# Altium footprint library klp.PcbLib: 436 footprints (part 10 of 28)
Each footprint in its own frame and in the unit in brackets; x right, y up, seen from the top. Pads: shape width x height; smd on the part's side, far side on the other; paste and mask are expansions set on the pad; w line width, h text height; cw(c..) or ccw(c..) is an arc to the next point about the centre after c.
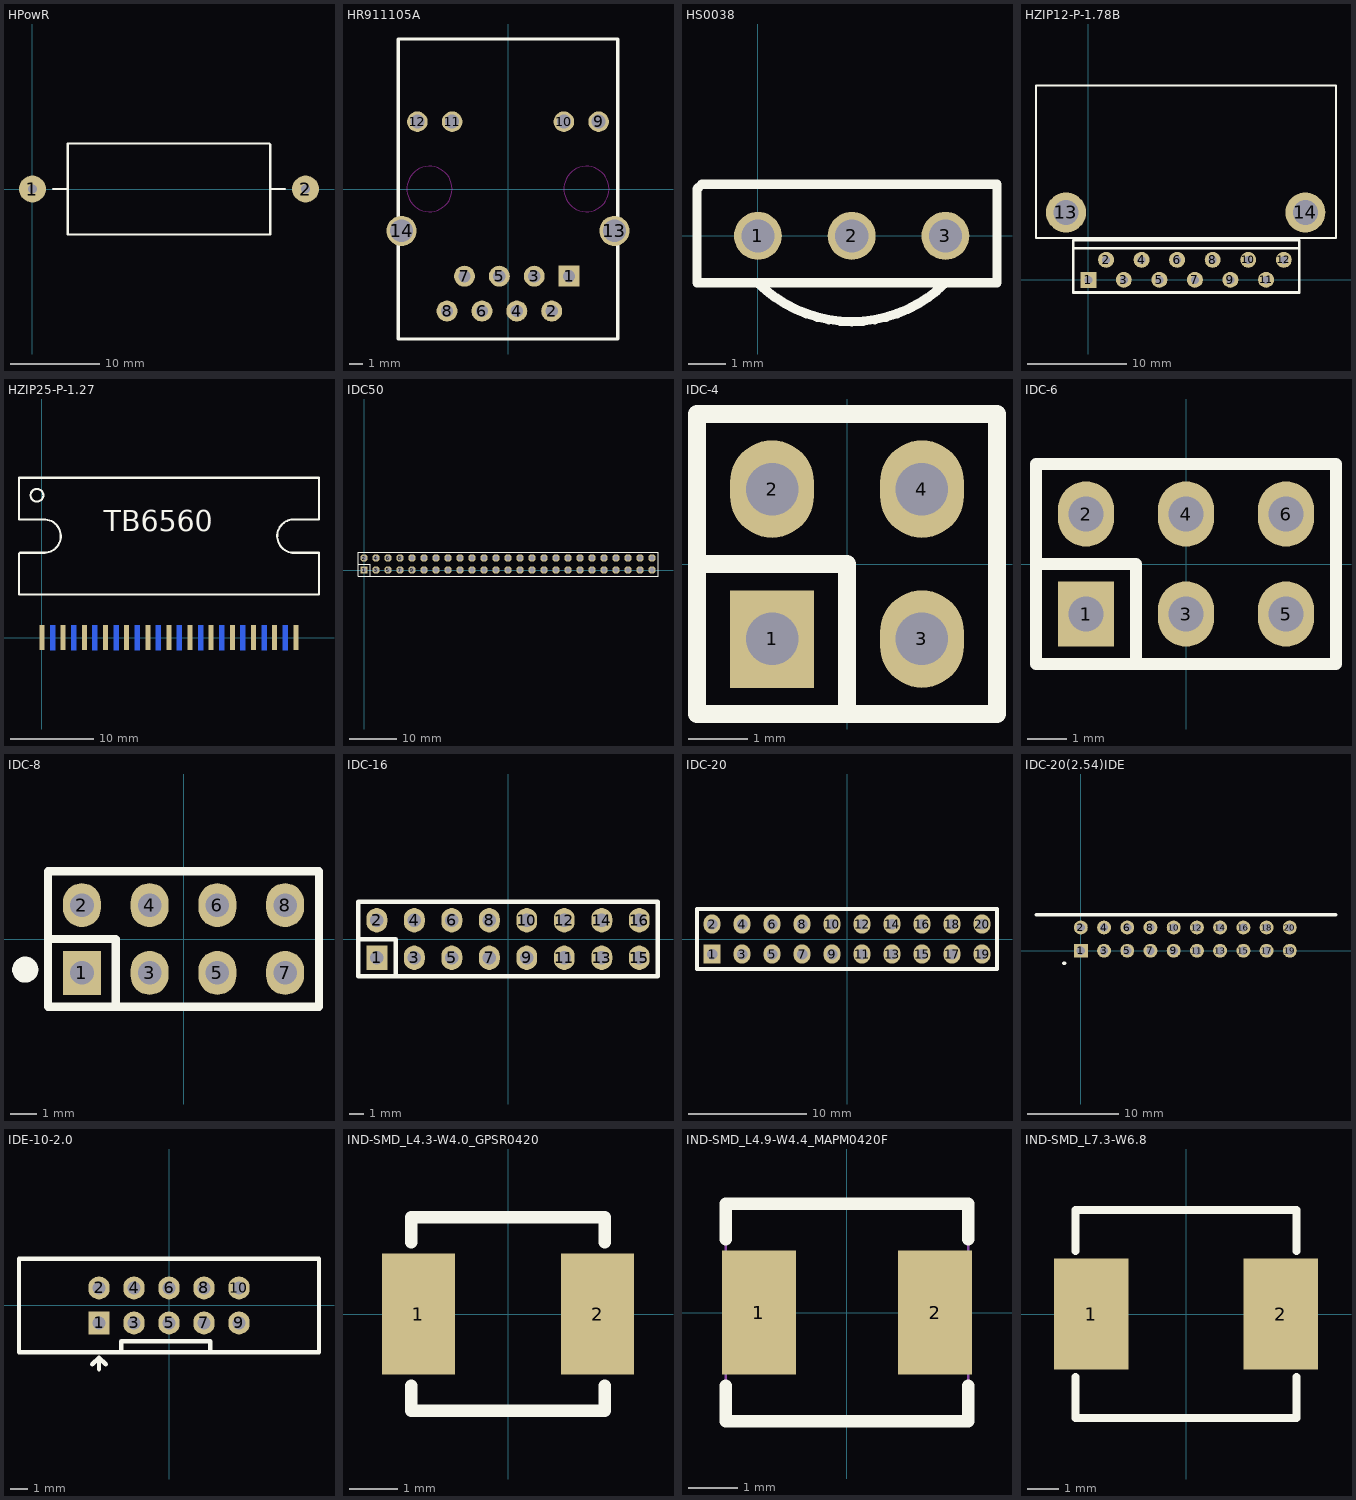
[diagram p9: the footprints below, top view; thin cyan lines are the x and y axes]

## HPowR [mm] "HPR"
height 10
pads (2):
  round 3 hole 1: 1(0,0) 2(30.48,0)
Top Overlay:
  lines w0.254: 2.286,0 3.937,0 ; 26.543,-2.921 26.543,2.794 ; 26.543,-2.667 26.543,-5.08 3.937,-5.08 3.937,-2.667 3.937,2.54 3.937,5.08 26.416,5.08 26.543,4.953 26.543,2.413 ; 26.543,0 28.194,0

## HR911105A [mm]
pads (14):
  rect 1.524x1.524 hole 0.889: 1(4.45,-6.35)
  round 1.524 hole 0.889: 2(3.18,-8.89) 3(1.91,-6.35) 4(0.64,-8.89) 5(-0.63,-6.35) 6(-1.9,-8.89) 7(-3.17,-6.35) 8(-4.44,-8.89)
  round 1.5 hole 1.02: 9(6.6,4.9) 10(4.064,4.9) 11(-4.064,4.9) 12(-6.6,4.9)
  round 2.2 hole 1.65: 13(7.75,-3.048) 14(-7.75,-3.048)
Top Overlay:
  lines w0.254: -8,-10.922 -8,10.922 0,10.922 8,10.922 8,-10.922 0,-10.922 -8,-10.922
Keep-Out Layer:
  circle w0.051: c-5.714,0 r1.65
  circle w0.051: c5.716,0 r1.65
3D body "User Library-HR911105A.step": height 14, standoff -2.5, extent -7.975,-10.475 7.905,10.925

## HS0038 [mm]
height 2.54
pads (3):
  round 1.3 hole 0.9: 1(0,0) 2(2.54,0) 3(5.08,0)
Top Overlay:
  lines w0.254: 0,-1.27 ccw(c2.54,1.27) 5.08,-1.27 ; -1.651,-1.27 6.477,-1.27 6.477,1.397 -1.524,1.397 -1.651,1.27 -1.651,-1.27

## HZIP12-P-1.78B [mm]
height 14.8
pads (14):
  rect 1.6x1.6 hole 0.8: 1(0,0)
  round 1.6 hole 0.8: 2(1.778,2) 3(3.556,0) 4(5.334,2) 5(7.112,0) 6(8.89,2) 7(10.668,0) 8(12.446,2) 9(14.224,0) 10(16.002,2) 11(17.78,0) 12(19.558,2)
  round 4 hole 2.5: 13(-2.227,6.731) 14(21.717,6.731)
Top Overlay:
  lines w0.2: -5.227,4.191 -5.227,19.431 24.779,19.431 24.779,4.191 -5.227,4.191
  lines w0.254: -1.524,3.175 21.082,3.175 ; -1.524,-1.27 -1.524,3.937 21.082,3.937 21.082,-1.27 -1.524,-1.27

## HZIP25-P-1.27 [mm] "thick:4.57,height:14,lenth:30,pin:1.27"
height 14
pads (25):
  rect 0.6x3 smd: 1(0,0) 3(2.54,0) 5(5.08,0) 7(7.62,0) 9(10.16,0) 11(12.7,0) 13(15.24,0) 15(17.78,0) 17(20.32,0) 19(22.86,0) 21(25.4,0) 23(27.94,0) 25(30.48,0)
  rect 0.6x3 smd far side: 2(1.27,0) 4(3.81,0) 6(6.35,0) 8(8.89,0) 10(11.43,0) 12(13.97,0) 14(16.51,0) 16(19.05,0) 18(21.59,0) 20(24.13,0) 22(26.67,0) 24(29.21,0)
Top Overlay:
  circle w0.254: c-0.6,17.1 r0.762
  lines w0.254: 0.2,14.195 cw(c0.26,12.195) 0.1,10.2 -2.66,10.2 -2.76,10.1 -2.76,5.2 0.8,5.2 33.26,5.2 33.26,10.2 30,10.2 ; 0.4,14.2 -2.76,14.2 -2.76,19.2 33.26,19.2 33.26,14.2 30,14.2 ; 30.3,10.2 cw(c30.24,12.2) 30.4,14.195
  text "TB6560" at 7.4,12.8 h2.5

## IDC50 [mil]
pads (50):
  rect 62x62 hole 40: 1(0,0)
  round 62 hole 40: 2(0,100) 3(100,0) 4(100,100) 5(200,0) 6(200,100) 7(300,0) 8(300,100) 9(400,0) 10(400,100) 11(500,0) 12(500,100) 13(600,0) 14(600,100) 15(700,0) 16(700,100) 17(800,0) 18(800,100) 19(900,0) 20(900,100) 21(1000,0) 22(1000,100) 23(1100,0) 24(1100,100) 25(1200,0) 26(1200,100) 27(1300,0) 28(1300,100) 29(1400,0) 30(1400,100) 31(1500,0) 32(1500,100) 33(1600,0) 34(1600,100) 35(1700,0) 36(1700,100) 37(1800,0) 38(1800,100) 39(1900,0) 40(1900,100) 41(2000,0) 42(2000,100) 43(2100,0) 44(2100,100) 45(2200,0) 46(2200,100) 47(2300,0) 48(2300,100) 49(2400,0) 50(2400,100)
Top Overlay:
  lines w6: -50,50 50,50 50,-50 ; -50,-50 2450,-50 2450,150 -50,150 -50,-50

## IDC-4 [mil]
pads (4):
  rect 56x65 hole 35: 1(-50,-50)
  oval 56x65 hole 35: 2(-50,50) 3(50,-50) 4(50,50)
Top Overlay:
  lines w12: -100,0 0,0 0,-100 ; -100,-100 100,-100 100,100 -100,100 -100,-100
3D body "HEADER.STEP": height 298.43, standoff -115.75, extent 0,-100 100,0
3D body "HEADER.STEP": height 298.43, standoff -115.75, extent -100,-100 0,0
3D body "HEADER.STEP": height 298.43, standoff -115.75, extent 0,0 100,100
3D body "HEADER.STEP": height 298.43, standoff -115.75, extent -100,0 0,100

## IDC-6 [mil]
pads (6):
  rect 56x65 hole 35: 1(-100,-50)
  oval 56x65 hole 35: 2(-100,50) 3(0,-50) 4(0,50) 5(100,-50) 6(100,50)
Top Overlay:
  lines w12: -150,0 -50,0 -50,-100 ; -150,-100 -150,100 150,100 150,-100 -150,-100
3D body "HEADER.STEP": height 298.43, standoff -115.75, extent -150,0 -50,100
3D body "HEADER.STEP": height 298.43, standoff -115.75, extent -50,0 50,100
3D body "HEADER.STEP": height 298.43, standoff -115.75, extent -150,-100 -50,0
3D body "HEADER.STEP": height 298.43, standoff -115.75, extent -50,-100 50,0
3D body "HEADER.STEP": height 298.43, standoff -115.75, extent 50,0 150,100
3D body "HEADER.STEP": height 298.43, standoff -115.75, extent 50,-100 150,0

## IDC-8 [mil]
pads (8):
  rect 56x65 hole 35: 1(-150,-50)
  oval 56x65 hole 35: 2(-150,50) 3(-50,-50) 4(-50,50) 5(50,-50) 6(50,50) 7(150,-50) 8(150,50)
Top Overlay:
  circle w20: c-233.64,-45.23 r9.22
  lines w12: -200,0 -100,0 -100,-100 ; -200,-100 200,-100 200,100 -200,100 -200,-100
3D body "HEADER.STEP": height 298.43, standoff -115.75, extent 100,-100 200,0
3D body "HEADER.STEP": height 298.43, standoff -115.75, extent 0,-100 100,0
3D body "HEADER.STEP": height 298.43, standoff -115.75, extent 100,0 200,100
3D body "HEADER.STEP": height 298.43, standoff -115.75, extent 0,0 100,100
3D body "HEADER.STEP": height 298.43, standoff -115.75, extent -100,-100 0,0
3D body "HEADER.STEP": height 298.43, standoff -115.75, extent -200,-100 -100,0
3D body "HEADER.STEP": height 298.43, standoff -115.75, extent -100,0 0,100
3D body "HEADER.STEP": height 298.43, standoff -115.75, extent -200,0 -100,100

## IDC-16 [mil]
pads (16):
  rect 56x65 hole 35: 1(-350,-50)
  oval 56x65 hole 35: 2(-350,50) 3(-250,-50) 4(-250,50) 5(-150,-50) 6(-150,50) 7(-50,-50) 8(-50,50) 9(50,-50) 10(50,50) 11(150,-50) 12(150,50) 13(250,-50) 14(250,50) 15(350,-50) 16(350,50)
Top Overlay:
  lines w12: -400,0 -300,0 -300,-100 ; -400,-100 -400,100 400,100 400,-100 -400,-100
3D body "HEADER.STEP": height 298.43, standoff -115.75, extent -400,0 -300,100
3D body "HEADER.STEP": height 298.43, standoff -115.75, extent -300,0 -200,100
3D body "HEADER.STEP": height 298.43, standoff -115.75, extent -400,-100 -300,0
3D body "HEADER.STEP": height 298.43, standoff -115.75, extent -300,-100 -200,0
3D body "HEADER.STEP": height 298.43, standoff -115.75, extent -200,0 -100,100
3D body "HEADER.STEP": height 298.43, standoff -115.75, extent -100,0 0,100
3D body "HEADER.STEP": height 298.43, standoff -115.75, extent -200,-100 -100,0
3D body "HEADER.STEP": height 298.43, standoff -115.75, extent -100,-100 0,0
3D body "HEADER.STEP": height 298.43, standoff -115.75, extent 0,0 100,100
3D body "HEADER.STEP": height 298.43, standoff -115.75, extent 100,0 200,100
3D body "HEADER.STEP": height 298.43, standoff -115.75, extent 0,-100 100,0
3D body "HEADER.STEP": height 298.43, standoff -115.75, extent 100,-100 200,0
3D body "HEADER.STEP": height 298.43, standoff -115.75, extent 200,0 300,100
3D body "HEADER.STEP": height 298.43, standoff -115.75, extent 300,0 400,100
3D body "HEADER.STEP": height 298.43, standoff -115.75, extent 200,-100 300,0
3D body "HEADER.STEP": height 298.43, standoff -115.75, extent 300,-100 400,0

## IDC-20 [mil]
pads (20):
  rect 56x65 hole 35: 1(-450,-50)
  oval 56x65 hole 35: 2(-450,50) 3(-350,-50) 4(-350,50) 5(-250,-50) 6(-250,50) 7(-150,-50) 8(-150,50) 9(-50,-50) 10(-50,50) 11(50,-50) 12(50,50) 13(150,-50) 14(150,50) 15(250,-50) 16(250,50) 17(350,-50) 18(350,50) 19(450,-50) 20(450,50)
Top Overlay:
  lines w12: -500,-100 500,-100 500,100 -500,100 -500,-100
3D body: height 393.7, standoff 0, extent -469.24,30.04 -429.87,69.41
3D body: height 393.7, standoff 0, extent -369.24,30.04 -329.87,69.41
3D body: height 393.7, standoff 0, extent -269.24,30.04 -229.87,69.41
3D body: height 393.7, standoff 0, extent -169.24,30.04 -129.87,69.41
3D body: height 393.7, standoff 0, extent -69.24,30.04 -29.87,69.41
3D body: height 393.7, standoff 0, extent 30.76,30.04 70.13,69.41
3D body: height 393.7, standoff 0, extent 130.76,30.04 170.13,69.41
3D body: height 393.7, standoff 0, extent 230.76,30.04 270.13,69.41
3D body: height 393.7, standoff 0, extent 330.76,30.04 370.13,69.41
3D body: height 393.7, standoff 0, extent 430.76,30.04 470.13,69.41
3D body: height 393.7, standoff 0, extent 430.76,-69.96 470.13,-30.59
3D body: height 393.7, standoff 0, extent 330.76,-69.96 370.13,-30.59
3D body: height 393.7, standoff 0, extent 230.76,-69.96 270.13,-30.59
3D body: height 393.7, standoff 0, extent 130.76,-69.96 170.13,-30.59
3D body: height 393.7, standoff 0, extent 30.76,-69.96 70.13,-30.59
3D body: height 393.7, standoff 0, extent -69.24,-69.96 -29.87,-30.59
3D body: height 393.7, standoff 0, extent -169.24,-69.96 -129.87,-30.59
3D body: height 393.7, standoff 0, extent -269.24,-69.96 -229.87,-30.59
3D body: height 393.7, standoff 0, extent -369.24,-69.96 -329.87,-30.59
3D body: height 393.7, standoff 0, extent -469.24,-69.96 -429.87,-30.59
3D body "HEADER.STEP": height 298.43, standoff -115.75, extent -400,-100 -300,0
3D body "HEADER.STEP": height 298.43, standoff -115.75, extent -500,-100 -400,0
3D body "HEADER.STEP": height 298.43, standoff -115.75, extent -400,0 -300,100
3D body "HEADER.STEP": height 298.43, standoff -115.75, extent -500,0 -400,100
3D body "HEADER.STEP": height 298.43, standoff -115.75, extent -200,-100 -100,0
3D body "HEADER.STEP": height 298.43, standoff -115.75, extent -300,-100 -200,0
3D body "HEADER.STEP": height 298.43, standoff -115.75, extent -200,0 -100,100
3D body "HEADER.STEP": height 298.43, standoff -115.75, extent -300,0 -200,100
3D body "HEADER.STEP": height 298.43, standoff -115.75, extent 0,-100 100,0
3D body "HEADER.STEP": height 298.43, standoff -115.75, extent -100,-100 0,0
3D body "HEADER.STEP": height 298.43, standoff -115.75, extent 0,0 100,100
3D body "HEADER.STEP": height 298.43, standoff -115.75, extent -100,0 0,100
3D body "HEADER.STEP": height 298.43, standoff -115.75, extent 200,-100 300,0
3D body "HEADER.STEP": height 298.43, standoff -115.75, extent 100,-100 200,0
3D body "HEADER.STEP": height 298.43, standoff -115.75, extent 200,0 300,100
3D body "HEADER.STEP": height 298.43, standoff -115.75, extent 100,0 200,100
3D body "HEADER.STEP": height 298.43, standoff -115.75, extent 400,-100 500,0
3D body "HEADER.STEP": height 298.43, standoff -115.75, extent 300,-100 400,0
3D body "HEADER.STEP": height 298.43, standoff -115.75, extent 400,0 500,100
3D body "HEADER.STEP": height 298.43, standoff -115.75, extent 300,0 400,100

## IDC-20(2.54)IDE [mil]
height 104.33
pads (20):
  rect 60x60 hole 36: 1(0,0)
  round 60 hole 36: 2(0,100) 3(100,0) 4(100,100) 5(200,0) 6(200,100) 7(300,0) 8(300,100) 9(400,0) 10(400,100) 11(500,0) 12(500,100) 13(600,0) 14(600,100) 15(700,0) 16(700,100) 17(800,0) 18(800,100) 19(900,0) 20(900,100)
Top Overlay:
  lines w15: -193,155 1099,155 ; -72.48,-54 -69,-54

## IDE-10-2.0 [mil]
pads (10):
  rect 48x52 hole 30: 1(-157.48,-39.37)
  oval 48x52 hole 30: 2(-157.48,39.37) 3(-78.74,-39.37) 4(-78.74,39.37) 5(0,-39.37) 6(0,39.37) 7(78.74,-39.37) 8(78.74,39.37) 9(157.48,-39.37) 10(157.48,39.37)
Top Overlay:
  lines w10: -172.48,-132.37 -157.48,-117.37 ; -157.48,-143.37 -157.48,-117.37 ; -142.48,-132.37 -157.48,-117.37 ; -107.48,-105 -107.48,-80 92.52,-80 92.52,-105 ; -337.48,-105 337.48,-105 337.48,105 -337.48,105 -337.48,-105

## IND-SMD_L4.3-W4.0_GPSR0420 [mm] "0420封装电感使用"
pads (2):
  rect 1.5x2.5 smd: 1(-1.85,0) 2(1.85,0)
Top Overlay:
  lines w0.254: -2,-1.481 -2,-2 2,-2 2,-1.481 ; -2,1.481 -2,2 2,2 2,1.481

## IND-SMD_L4.9-W4.4_MAPM0420F [mm]
pads (2):
  rect 1.5x2.5 smd paste+0 mask+0.051: 1(-1.78,0) 2(1.78,0)
Top Overlay:
  lines w0.254: -2.45,-1.481 -2.45,-2.2 2.45,-2.2 2.45,-1.481 ; -2.45,1.481 -2.45,2.2 2.45,2.2 2.45,1.481
Mechanical 15:
  region: -2.45,0.75 -1.45,0.75 -1.45,-0.75 -2.45,-0.75
  region: 1.45,0.75 2.45,0.75 2.45,-0.75 1.45,-0.75
  region: -2.39,-2.2 -2.39,-2.175 -2.425,-2.14 -2.475,-2.14 -2.51,-2.175 -2.51,-2.2 -2.51,-2.225 -2.475,-2.26 -2.425,-2.26 -2.39,-2.225 -2.39,-2.2
  lines w0.051: -2.45,-2.2 -2.45,2.2 2.45,2.2 2.45,-2.2 -2.45,-2.2

## IND-SMD_L7.3-W6.8 [mm]
pads (2):
  rect 2.35x3.5 smd: 1(-3,0) 2(3,0)
Top Overlay:
  lines w0.254: -3.5,-2 -3.5,-3.3 3.5,-3.3 3.5,-2 ; -3.5,2 -3.5,3.3 3.5,3.3 3.5,2